# Altium footprint library pcb.PcbLib: 397 footprints (part 24 of 25)
Each footprint in its own frame and in the unit in brackets; x right, y up, seen from the top. Pads: shape width x height; smd on the part's side, far side on the other; paste and mask are expansions set on the pad; w line width, h text height; cw(c..) or ccw(c..) is an arc to the next point about the centre after c.
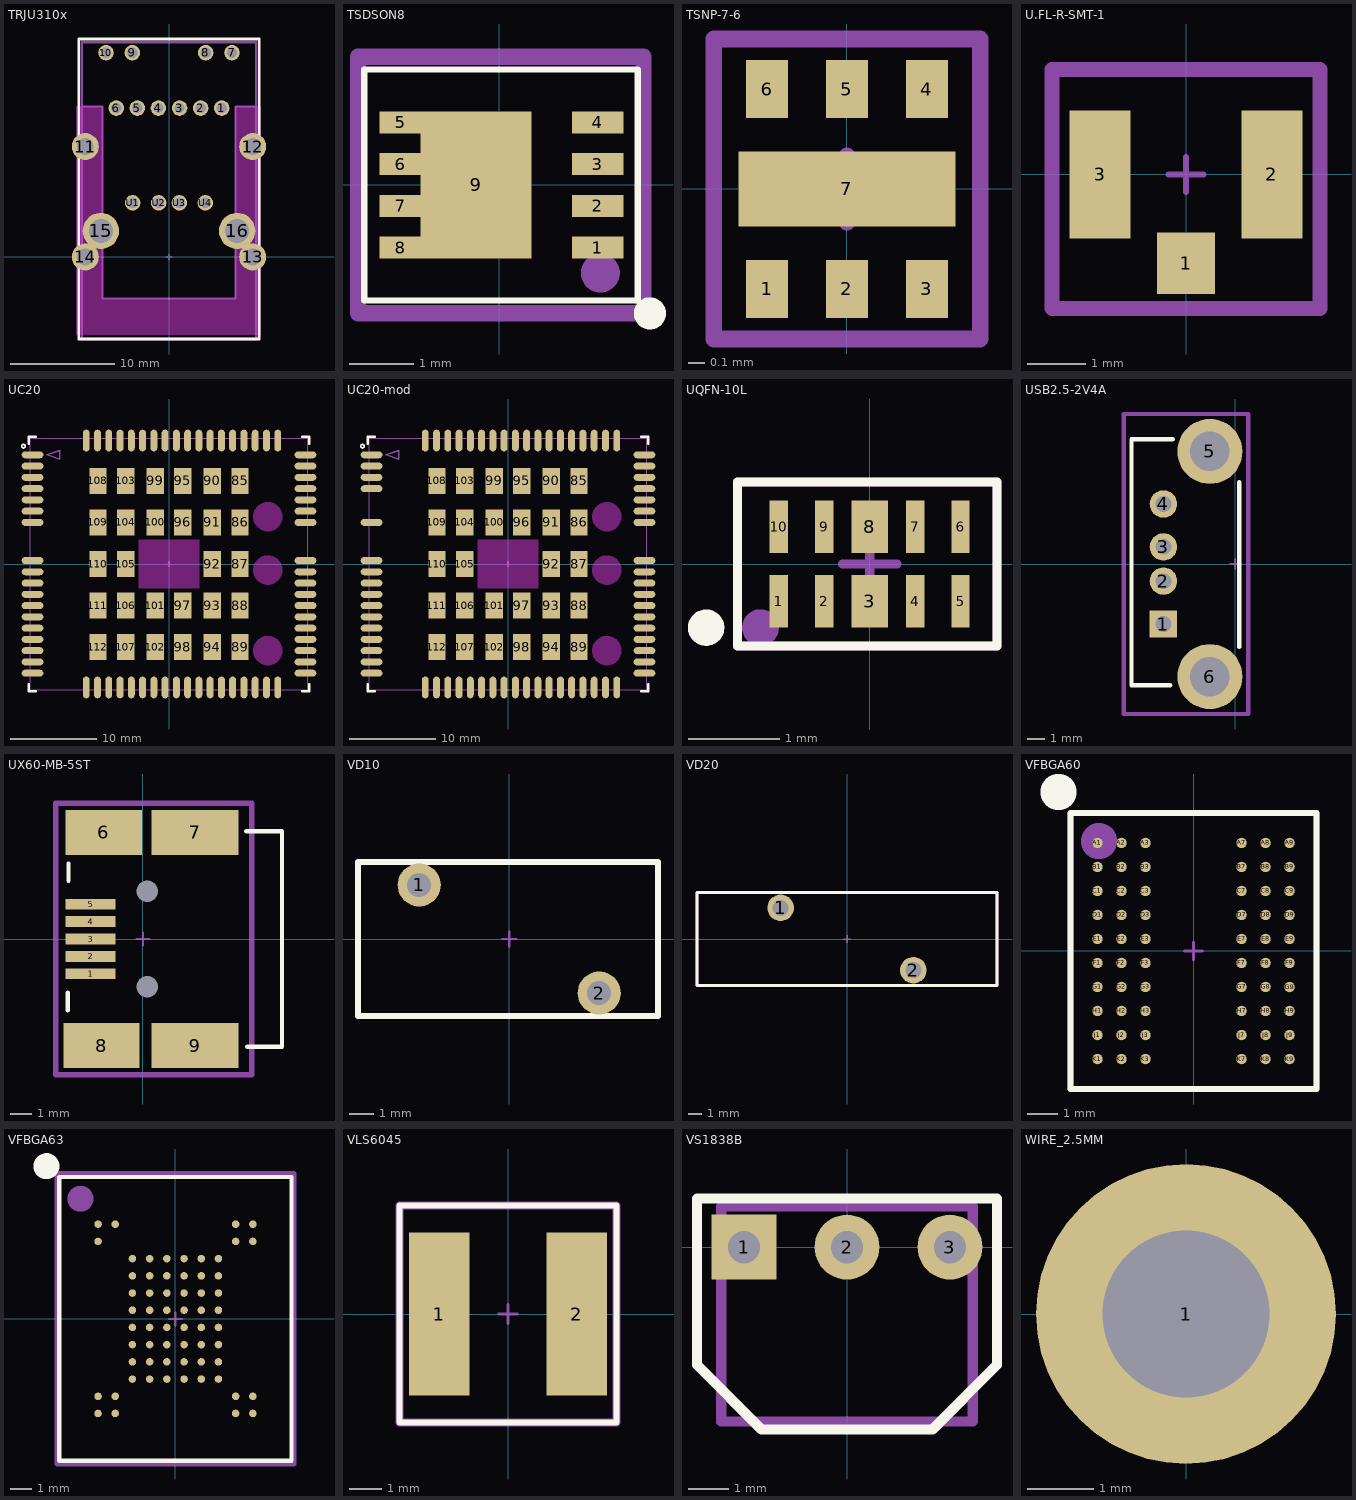
[diagram p23: the footprints below, top view; thin cyan lines are the x and y axes]

## TRJU310x [mm]
height 21.8
pads (20):
  round 1.5 hole 1: 1(5.075,14.35) 2(3.045,14.35) 3(1.015,14.35) 4(-1.015,14.35) 5(-3.045,14.35) 6(-5.075,14.35) 7(6.07,19.68) 8(3.53,19.68) 9(-3.53,19.68) 10(-6.07,19.68) U1(-3.5,5.21) U2(-1,5.21) U3(1,5.21) U4(3.5,5.21)
  round 2.6 hole 1.6: 11(-8.065,10.64) 12(8.065,10.64) 13(8.065,0) 14(-8.065,0)
  round 3.5 hole 2.3: 15(-6.565,2.51) 16(6.565,2.51)
Top Layer keep-out:
  region: -8.95,14.5 -8.95,-7.5 8.85,-7.5 8.85,14.5 6.4,14.5 6.4,-4 -6.4,-4 -6.4,14.5
Top Overlay:
  lines w0.254: -8.7,-7.9 -8.7,21 8.7,21 8.7,-7.9 -8.7,-7.9
Mechanical 15:
  lines w0.1: -0.3,0 0.3,0 ; 0,-0.3 0,0.3
  lines w0.2: -8.4,14.5 -6.4,14.5 -6.4,-4 6.4,-4 6.4,14.5 8.4,14.5
  lines w0.254: -8.4,-7.9 8.4,-7.9 8.4,20.7 -8.4,20.7 -8.4,-7.9
  text ".Designator" at -4.5,-6.1 h1.02
  text "pcb_edge" at -3.3,-9.1 h1.02
3D body "ARJU21A-MC.stp": height 22.74, standoff -2.72, extent -9.59,-8.04 9.59,20.6

## TSDSON8 [mm]
height 1
pads (9):
  rect 0.8x0.34 smd paste-0.02 mask+0.07: 1(1.538,-0.975) 2(1.538,-0.325) 3(1.538,0.325) 4(1.538,0.975)
  rect 0.65x0.34 smd paste-0.02 mask+0.07: 5(-1.538,0.975) 6(-1.538,0.325) 7(-1.538,-0.325) 8(-1.538,-0.975)
  rect 1.73x2.29 smd paste-1000 mask+0.07: 9(-0.358,0)
Top Overlay:
  circle w0.25: c2.35,-2 r0.125
  lines w0.1: -2.1,-1.8 -2.1,1.8 2.159,1.8 2.159,-1.8 -2.1,-1.8
Top Paste:
  rectangle: -0.254,0.051 0.386,1.051
  rectangle: -0.254,-1.067 0.386,-0.067
  rectangle: -1.067,0.051 -0.427,1.051
  rectangle: -1.067,-1.051 -0.427,-0.051
Mechanical 15:
  circle w0.406: c1.576,-1.372 r0.1
  lines w0.1: -0.3,0 0.3,0 ; 0,-0.3 0,0.3
  lines w0.254: -2.2,-2 -2.2,2 2.25,2 2.25,-2 -2.2,-2
  text ".Designator" at -1.575,0.406 h1.02
3D body: height 1, standoff 0, extent -1.7,-1.7 1.7,1.7

## TSNP-7-6 [mm] "TSNP-7-6"
height 0.7
pads (7):
  rect 0.25x0.35 smd paste-0.03 mask+0.07: 1(-0.48,-0.6) 2(0,-0.6) 3(0.48,-0.6) 4(0.48,0.6) 5(0,0.6) 6(-0.48,0.6)
  rect 1.3x0.45 smd paste-100 mask+0.07: 7(0,0)
Top Paste:
  region: 0.25,-0.15 0.25,0.15 0.05,0.15 0.05,-0.15
  region: 0.55,-0.15 0.55,0.15 0.35,0.15 0.35,-0.15
  region: -0.05,-0.15 -0.05,0.15 -0.25,0.15 -0.25,-0.15
  region: -0.35,-0.15 -0.35,0.15 -0.55,0.15 -0.55,-0.15
Mechanical 15:
  lines w0.1: -0.2,0 0.2,0 ; 0,-0.2 0,0.2 ; -0.8,-0.9 0.8,-0.9 0.8,0.9 -0.8,0.9 -0.8,-0.9
  text ".Designator" at 0.6,-0.7 h0.51
3D body: height 0.5, standoff 0, extent -0.65,-0.7 0.6,0.7

## U.FL-R-SMT-1 [mm]
height 3
pads (3):
  rect 1x1.05 smd: 1(0,-1.525)
  rect 1.05x2.2 smd: 2(1.475,0) 3(-1.475,0)
Mechanical 15:
  lines w0.1: -0.3,0 0.3,0 ; 0,-0.3 0,0.3
  lines w0.254: -2.3,-2.3 -2.3,1.8 2.3,1.8 2.3,-2.3 -2.3,-2.3
  text ".Designator" at -1.9,-1.9 h1.02
3D body "U.FL-R-SMT-1.stp": height 1.25, standoff 0, extent -1.5,-1.525 1.5,1.575

## UC20 [mm]
height 0.8
pads (100):
  oval 2.5x0.8 smd paste-10 mask+0.05: 1(-15.75,12.6) 2(-15.75,11.3) 3(-15.75,10) 4(-15.75,8.7) 5(-15.75,7.4) 6(-15.75,6.1) 7(-15.75,4.8) 8(-15.75,0.4) 9(-15.75,-0.9) 10(-15.75,-2.2) 11(-15.75,-3.5) 12(-15.75,-4.8) 13(-15.75,-6.1) 14(-15.75,-7.4) 15(-15.75,-8.7) 16(-15.75,-10) 17(-15.75,-11.3) 18(-15.75,-12.6) 37(15.75,-12.6) 38(15.75,-11.3) 39(15.75,-10) 40(15.75,-8.7) 41(15.75,-7.4) 42(15.75,-6.1) 43(15.75,-4.8) 44(15.75,-3.5) 45(15.75,-2.2) 46(15.75,-0.9) 47(15.75,0.4) 48(15.75,4.8) 49(15.75,6.1) 50(15.75,7.4) 51(15.75,8.7) 52(15.75,10) 53(15.75,11.3) 54(15.75,12.6)
  oval 0.8x2.5 smd paste-10 mask+0.05: 19(-9.55,-14.25) 20(-8.25,-14.25) 21(-6.95,-14.25) 22(-5.65,-14.25) 23(-4.35,-14.25) 24(-3.05,-14.25) 25(-1.75,-14.25) 26(-0.45,-14.25) 27(0.85,-14.25) 28(2.15,-14.25) 29(3.45,-14.25) 30(4.75,-14.25) 31(6.05,-14.25) 32(7.35,-14.25) 33(8.65,-14.25) 34(9.95,-14.25) 35(11.25,-14.25) 36(12.55,-14.25) 55(12.55,14.25) 56(11.25,14.25) 57(9.95,14.25) 58(8.65,14.25) 59(7.35,14.25) 60(6.05,14.25) 61(4.75,14.25) 62(3.45,14.25) 63(2.15,14.25) 64(0.85,14.25) 65(-0.45,14.25) 66(-1.75,14.25) 67(-3.05,14.25) 68(-4.35,14.25) 69(-5.65,14.25) 70(-6.95,14.25) 71(-8.25,14.25) 72(-9.55,14.25)
  rect 2x3 smd paste-10 mask+0.05: 85(8.2,9.6) 86(8.2,4.8) 87(8.2,0) 88(8.2,-4.8) 89(8.2,-9.6) 90(5,9.6) 91(5,4.8) 92(5,0) 93(5,-4.8) 94(5,-9.6) 95(1.6,9.6) 96(1.6,4.8) 97(1.6,-4.8) 98(1.6,-9.6) 99(-1.6,9.6) 100(-1.6,4.8) 101(-1.6,-4.8) 102(-1.6,-9.6) 103(-5,9.6) 104(-5,4.8) 105(-5,0) 106(-5,-4.8) 107(-5,-9.6) 108(-8.2,9.6) 109(-8.2,4.8) 110(-8.2,0) 111(-8.2,-4.8) 112(-8.2,-9.6)
Top Layer keep-out:
  circle w1.7: c11.4,5.46 r0.85
  circle w1.7: c11.4,-0.7 r0.85
  circle w1.7: c11.4,-10 r0.85
  rectangle: -3.5,-2.8 3.5,2.8
Top Overlay:
  circle w0.2: c-16.8,13.6 r0.2
  lines w0.3: -16.2,-13.9 -16.2,-14.7 -15.4,-14.7 ; -16.2,13.9 -16.2,14.7 -15.4,14.7 ; 15.4,-14.7 16.2,-14.7 16.2,-13.9 ; 15.4,14.7 16.2,14.7 16.2,13.9
Top Paste:
  drawing of 328 lines, arcs and shapes, not listed
Mechanical 15:
  lines w0.1: -0.3,0 0.3,0 ; 0,-0.3 0,0.3 ; -16,-14.5 -16,14.5 16,14.5 16,-14.5 -16,-14.5
  lines w0.2: -14.1,12.6 -12.6,13.1 -12.6,12.1 -14.1,12.6
  text ".Designator" at -10.9,-2.8 h1.02
3D body: height 2.65, standoff 0, extent -16,-14.5 16,14.5

## UC20-mod [mm]
height 0.8
pads (98):
  oval 2.5x0.8 smd paste-10 mask+0.05: 1(-15.75,12.6) 2(-15.75,11.3) 3(-15.75,10) 4(-15.75,8.7) 7(-15.75,4.8) 8(-15.75,0.4) 9(-15.75,-0.9) 10(-15.75,-2.2) 11(-15.75,-3.5) 12(-15.75,-4.8) 13(-15.75,-6.1) 14(-15.75,-7.4) 15(-15.75,-8.7) 16(-15.75,-10) 17(-15.75,-11.3) 18(-15.75,-12.6) 37(15.75,-12.6) 38(15.75,-11.3) 39(15.75,-10) 40(15.75,-8.7) 41(15.75,-7.4) 42(15.75,-6.1) 43(15.75,-4.8) 44(15.75,-3.5) 45(15.75,-2.2) 46(15.75,-0.9) 47(15.75,0.4) 48(15.75,4.8) 49(15.75,6.1) 50(15.75,7.4) 51(15.75,8.7) 52(15.75,10) 53(15.75,11.3) 54(15.75,12.6)
  oval 0.8x2.5 smd paste-10 mask+0.05: 19(-9.55,-14.25) 20(-8.25,-14.25) 21(-6.95,-14.25) 22(-5.65,-14.25) 23(-4.35,-14.25) 24(-3.05,-14.25) 25(-1.75,-14.25) 26(-0.45,-14.25) 27(0.85,-14.25) 28(2.15,-14.25) 29(3.45,-14.25) 30(4.75,-14.25) 31(6.05,-14.25) 32(7.35,-14.25) 33(8.65,-14.25) 34(9.95,-14.25) 35(11.25,-14.25) 36(12.55,-14.25) 55(12.55,14.25) 56(11.25,14.25) 57(9.95,14.25) 58(8.65,14.25) 59(7.35,14.25) 60(6.05,14.25) 61(4.75,14.25) 62(3.45,14.25) 63(2.15,14.25) 64(0.85,14.25) 65(-0.45,14.25) 66(-1.75,14.25) 67(-3.05,14.25) 68(-4.35,14.25) 69(-5.65,14.25) 70(-6.95,14.25) 71(-8.25,14.25) 72(-9.55,14.25)
  rect 2x3 smd paste-10 mask+0.05: 85(8.2,9.6) 86(8.2,4.8) 87(8.2,0) 88(8.2,-4.8) 89(8.2,-9.6) 90(5,9.6) 91(5,4.8) 92(5,0) 93(5,-4.8) 94(5,-9.6) 95(1.6,9.6) 96(1.6,4.8) 97(1.6,-4.8) 98(1.6,-9.6) 99(-1.6,9.6) 100(-1.6,4.8) 101(-1.6,-4.8) 102(-1.6,-9.6) 103(-5,9.6) 104(-5,4.8) 105(-5,0) 106(-5,-4.8) 107(-5,-9.6) 108(-8.2,9.6) 109(-8.2,4.8) 110(-8.2,0) 111(-8.2,-4.8) 112(-8.2,-9.6)
Top Layer keep-out:
  circle w1.7: c11.4,5.46 r0.85
  circle w1.7: c11.4,-0.7 r0.85
  circle w1.7: c11.4,-10 r0.85
  rectangle: -3.5,-2.8 3.5,2.8
Top Overlay:
  circle w0.2: c-16.8,13.6 r0.2
  lines w0.3: -16.2,-13.9 -16.2,-14.7 -15.4,-14.7 ; -16.2,13.9 -16.2,14.7 -15.4,14.7 ; 15.4,-14.7 16.2,-14.7 16.2,-13.9 ; 15.4,14.7 16.2,14.7 16.2,13.9
Top Paste:
  drawing of 322 lines, arcs and shapes, not listed
Mechanical 15:
  lines w0.1: -0.3,0 0.3,0 ; 0,-0.3 0,0.3 ; -16,-14.5 -16,14.5 16,14.5 16,-14.5 -16,-14.5
  lines w0.2: -14.1,12.6 -12.6,13.1 -12.6,12.1 -14.1,12.6
  text ".Designator" at -10.9,-2.8 h1.02
3D body: height 2.65, standoff 0, extent -16,-14.5 16,14.5

## UQFN-10L [mm]
height 0.5
pads (10):
  rect 0.2x0.58 smd paste-0.01 mask+0.07: 1(-1,-0.41) 2(-0.5,-0.41) 4(0.5,-0.41) 5(1,-0.41) 6(1,0.41) 7(0.5,0.41) 9(-0.5,0.41) 10(-1,0.41)
  rect 0.4x0.58 smd paste-0.01 mask+0.07: 3(0,-0.41) 8(0,0.41)
Top Overlay:
  circle w0.2: c-1.8,-0.7 r0.1
  lines w0.1: -1.452,-0.9 -1.452,0.9 1.4,0.9 1.4,-0.9 -1.452,-0.9
Mechanical 15:
  circle w0.2: c-1.202,-0.7 r0.102
  lines w0.1: -0.3,0 0.3,0 ; 0,-0.3 0,0.3 ; -1.452,-0.9 1.4,-0.9 1.4,0.9 -1.452,0.9 -1.452,-0.9
  text ".Designator" at -1.3,0.2 h0.76
3D body: height 1, standoff 0, extent -1.25,-0.5 1.25,0.5

## USB2.5-2V4A [mm] "Connector; USB1.1, Type A, Thru-Hole; 4 Position; Vertical"
height 15
pads (6):
  rect 1.6x1.6 hole 0.92: 1(-4.19,-3.5)
  round 1.6 hole 0.92: 2(-4.19,-1) 3(-4.19,1) 4(-4.19,3.5)
  round 3.8 hole 2.3: 5(-1.48,6.57) 6(-1.48,-6.57)
Top Overlay:
  lines w0.25: -3.8,-7.075 -6.05,-7.075 -6.05,7.275 -3.65,7.275 ; 0.225,-4.845 0.225,4.775
Mechanical 15:
  lines w0.1: -0.3,0 0.3,0 ; 0,-0.3 0,0.3
  lines w0.254: -6.5,-8.75 -6.5,8.75 0.75,8.75 0.75,-8.75 -6.5,-8.75
  text ".Designator" at -2.286,4.369 h1.02
3D body "c-1734366-1-c-3d.stp": height 15, standoff -3.93, extent -6.52,-7.799 0.6,7.999

## UX60-MB-5ST [mm] "Connector; USB2.0, Type AB, SM; 5 Position; Right Angle"
height 3.9
pads (11):
  rect 2.3x0.5 smd: 1(-2.4,-1.6) 2(-2.4,-0.8) 3(-2.4,0) 4(-2.4,0.8) 5(-2.4,1.6)
  rect 3.5x2.05 smd: 6(-1.8,4.9) 8(-1.9,-4.9)
  rect 4x2.05 smd: 7(2.4,4.9) 9(2.4,-4.9)
  round 0 hole 1 unplated: MH1(0.2,2.2) MH2(0.2,-2.2)
Top Overlay:
  lines w0.2: -3.45,-3.275 -3.45,-2.475 ; -3.425,2.675 -3.425,3.475 ; 4.75,4.95 6.4,4.95 6.4,-4.95 4.8,-4.95
Mechanical 15:
  lines w0.1: -0.3,0 0.3,0 ; 0,-0.3 0,0.3
  lines w0.254: -4,-6.25 -4,6.25 5,6.25 5,-6.25 -4,-6.25
  text "pcb_edge" at 6.25,-1.25 h1.02
  text ".Designator" at 3.5,3.25 h1.02
3D body "565790576.stp": height 3.95, standoff 0, extent -3,-4.95 6,4.95

## VD10 [mm]
height 15.5
pads (2):
  round 1.8 hole 1: 1(-3.75,2.25) 2(3.75,-2.25)
Top Overlay:
  lines w0.254: -6.3,-3.2 6.2,-3.2 6.2,3.2 -6.3,3.2 -6.3,-3.2
Mechanical 15:
  lines w0.1: -0.3,0 0.3,0 ; 0,-0.3 0,0.3
  lines w0.254: -6.3,-3.2 -6.3,3.2 6.2,3.2 6.2,-3.2 -6.3,-3.2
  text ".Designator" at -5.4,-2.5 h1.02
3D body: height 15.49, standoff 3.01, extent -6.225,-3.3 6.225,3.1

## VD20 [mm]
height 25.5
pads (2):
  round 2 hole 1.2: 1(-5,2.35) 2(5,-2.35)
Top Overlay:
  lines w0.254: -11.3,-3.5 -11.3,3.5 11.3,3.5 11.3,-3.5 -11.3,-3.5
Mechanical 15:
  lines w0.1: -0.3,0 0.3,0 ; 0,-0.3 0,0.3
  lines w0.254: -11.3,-3.5 11.3,-3.5 11.3,3.5 -11.3,3.5 -11.3,-3.5
  text ".Designator" at -10.2,-2.9 h1.02
3D body: height 25.48, standoff 3.02, extent -11.211,-3.5 11.2,3.5

## VFBGA60 [mm]
height 1
pads (60):
  round 0.35 smd paste+0 mask+0.075: A1(-3.2,3.6) A2(-2.4,3.6) A3(-1.6,3.6) A7(1.6,3.6) A8(2.4,3.6) A9(3.2,3.6) B1(-3.2,2.8) B2(-2.4,2.8) B3(-1.6,2.8) B7(1.6,2.8) B8(2.4,2.8) B9(3.2,2.8) C1(-3.2,2) C2(-2.4,2) C3(-1.6,2) C7(1.6,2) C8(2.4,2) C9(3.2,2) D1(-3.2,1.2) D2(-2.4,1.2) D3(-1.6,1.2) D7(1.6,1.2) D8(2.4,1.2) D9(3.2,1.2) E1(-3.2,0.4) E2(-2.4,0.4) E3(-1.6,0.4) E7(1.6,0.4) E8(2.4,0.4) E9(3.2,0.4) F1(-3.2,-0.4) F2(-2.4,-0.4) F3(-1.6,-0.4) F7(1.6,-0.4) F8(2.4,-0.4) F9(3.2,-0.4) G1(-3.2,-1.2) G2(-2.4,-1.2) G3(-1.6,-1.2) G7(1.6,-1.2) G8(2.4,-1.2) G9(3.2,-1.2) H1(-3.2,-2) H2(-2.4,-2) H3(-1.6,-2) H7(1.6,-2) H8(2.4,-2) H9(3.2,-2) J1(-3.2,-2.8) J2(-2.4,-2.8) J3(-1.6,-2.8) J7(1.6,-2.8) J8(2.4,-2.8) J9(3.2,-2.8) K1(-3.2,-3.6) K2(-2.4,-3.6) K3(-1.6,-3.6) K7(1.6,-3.6) K8(2.4,-3.6) K9(3.2,-3.6)
Top Overlay:
  circle w1: c-4.5,5.3 r0.1
  lines w0.2: -4.1,-4.6 4.1,-4.6 4.1,4.6 -4.1,4.6 -4.1,-4.6
Mechanical 15:
  circle w1: c-3.148,3.664 r0.1
  lines w0.1: -0.3,0 0.3,0 ; 0,-0.3 0,0.3
  lines w0.2: -4.1,-4.6 4.1,-4.6 4.1,4.6 -4.1,4.6 -4.1,-4.6
  text ".Designator" at -3.556,1.886 h1.02
3D body: height 1.55, standoff 0, extent -4,-4.5 4,4.5

## VFBGA63 [mm]
height 1
pads (63):
  round 0.35 smd paste+0 mask+0.075: A1(-3.6,4.4) A2(-2.8,4.4) A9(2.8,4.4) A10(3.6,4.4) B1(-3.6,3.6) B9(2.8,3.6) B10(3.6,3.6) C3(-2,2.8) C4(-1.2,2.8) C5(-0.4,2.8) C6(0.4,2.8) C7(1.2,2.8) C8(2,2.8) D3(-2,2) D4(-1.2,2) D5(-0.4,2) D6(0.4,2) D7(1.2,2) D8(2,2) E3(-2,1.2) E4(-1.2,1.2) E5(-0.4,1.2) E6(0.4,1.2) E7(1.2,1.2) E8(2,1.2) F3(-2,0.4) F4(-1.2,0.4) F5(-0.4,0.4) F6(0.4,0.4) F7(1.2,0.4) F8(2,0.4) G3(-2,-0.4) G4(-1.2,-0.4) G5(-0.4,-0.4) G6(0.4,-0.4) G7(1.2,-0.4) G8(2,-0.4) H3(-2,-1.2) H4(-1.2,-1.2) H5(-0.4,-1.2) H6(0.4,-1.2) H7(1.2,-1.2) H8(2,-1.2) J3(-2,-2) J4(-1.2,-2) J5(-0.4,-2) J6(0.4,-2) J7(1.2,-2) J8(2,-2) K3(-2,-2.8) K4(-1.2,-2.8) K5(-0.4,-2.8) K6(0.4,-2.8) K7(1.2,-2.8) K8(2,-2.8) L1(-3.6,-3.6) L2(-2.8,-3.6) L9(2.8,-3.6) L10(3.6,-3.6) M1(-3.6,-4.4) M2(-2.8,-4.4) M9(2.8,-4.4) M10(3.6,-4.4)
Top Overlay:
  circle w1: c-6,7.1 r0.1
  lines w0.2: -5.4,-6.6 -5.4,6.6 5.4,6.6 5.4,-6.6 -5.4,-6.6
Mechanical 15:
  circle w1: c-4.418,5.588 r0.1
  lines w0.1: -0.3,0 0.3,0 ; 0,-0.3 0,0.3
  lines w0.254: -5.5,-6.75 5.5,-6.75 5.5,6.75 -5.5,6.75 -5.5,-6.75
  text ".Designator" at -4.318,2.794 h1.02
3D body: height 1, standoff 0, extent -5.3,-6.5 5.3,6.5

## VLS6045 [mm]
height 4.5
pads (2):
  rect 1.9x5.1 smd: 1(-2.15,0) 2(2.15,0)
Top Overlay:
  lines w0.2: -3.4,-3.4 -3.4,3.4 3.4,3.4 3.4,-3.4 -3.4,-3.4
Mechanical 15:
  lines w0.1: -0.3,0 0.3,0 ; 0,-0.3 0,0.3
  lines w0.254: -3.4,-3.4 -3.4,3.4 3.4,3.4 3.4,-3.4 -3.4,-3.4
  text ".Designator" at -1.575,-1.524 h1.02
3D body: height 4.5, standoff 0, extent -3.2,-3.2 3.2,3.2

## VS1838B [mm]
height 2.38
pads (3):
  rect 1.6x1.6 hole 0.8: 1(-2.54,0)
  round 1.6 hole 0.8: 2(0,0) 3(2.54,0)
Top Overlay:
  lines w0.254: -3.7,-2.9 -3.7,1.2 3.7,1.2 3.7,-2.9 2.1,-4.5 -2.1,-4.5 -3.7,-2.9
Mechanical 15:
  lines w0.1: -0.3,0 0.3,0 ; 0,-0.3 0,0.3
  lines w0.254: -3.1,-4.3 3.1,-4.3 3.1,1 -3.1,1 -3.1,-4.3
  text ".Designator" at -4.572,-2.286 h1.02
3D body: height 7.1, standoff 0, extent -3.1,-4.3 3.1,0.825

## WIRE_2.5MM [mm]
pads (1):
  round 4.5 hole 2.5: 1(0,0)